# Altium footprint library my Library.PcbLib: 1247 footprints (part 71 of 78)
Each footprint in its own frame and in the unit in brackets; x right, y up, seen from the top. Pads: shape width x height; smd on the part's side, far side on the other; paste and mask are expansions set on the pad; w line width, h text height; cw(c..) or ccw(c..) is an arc to the next point about the centre after c.
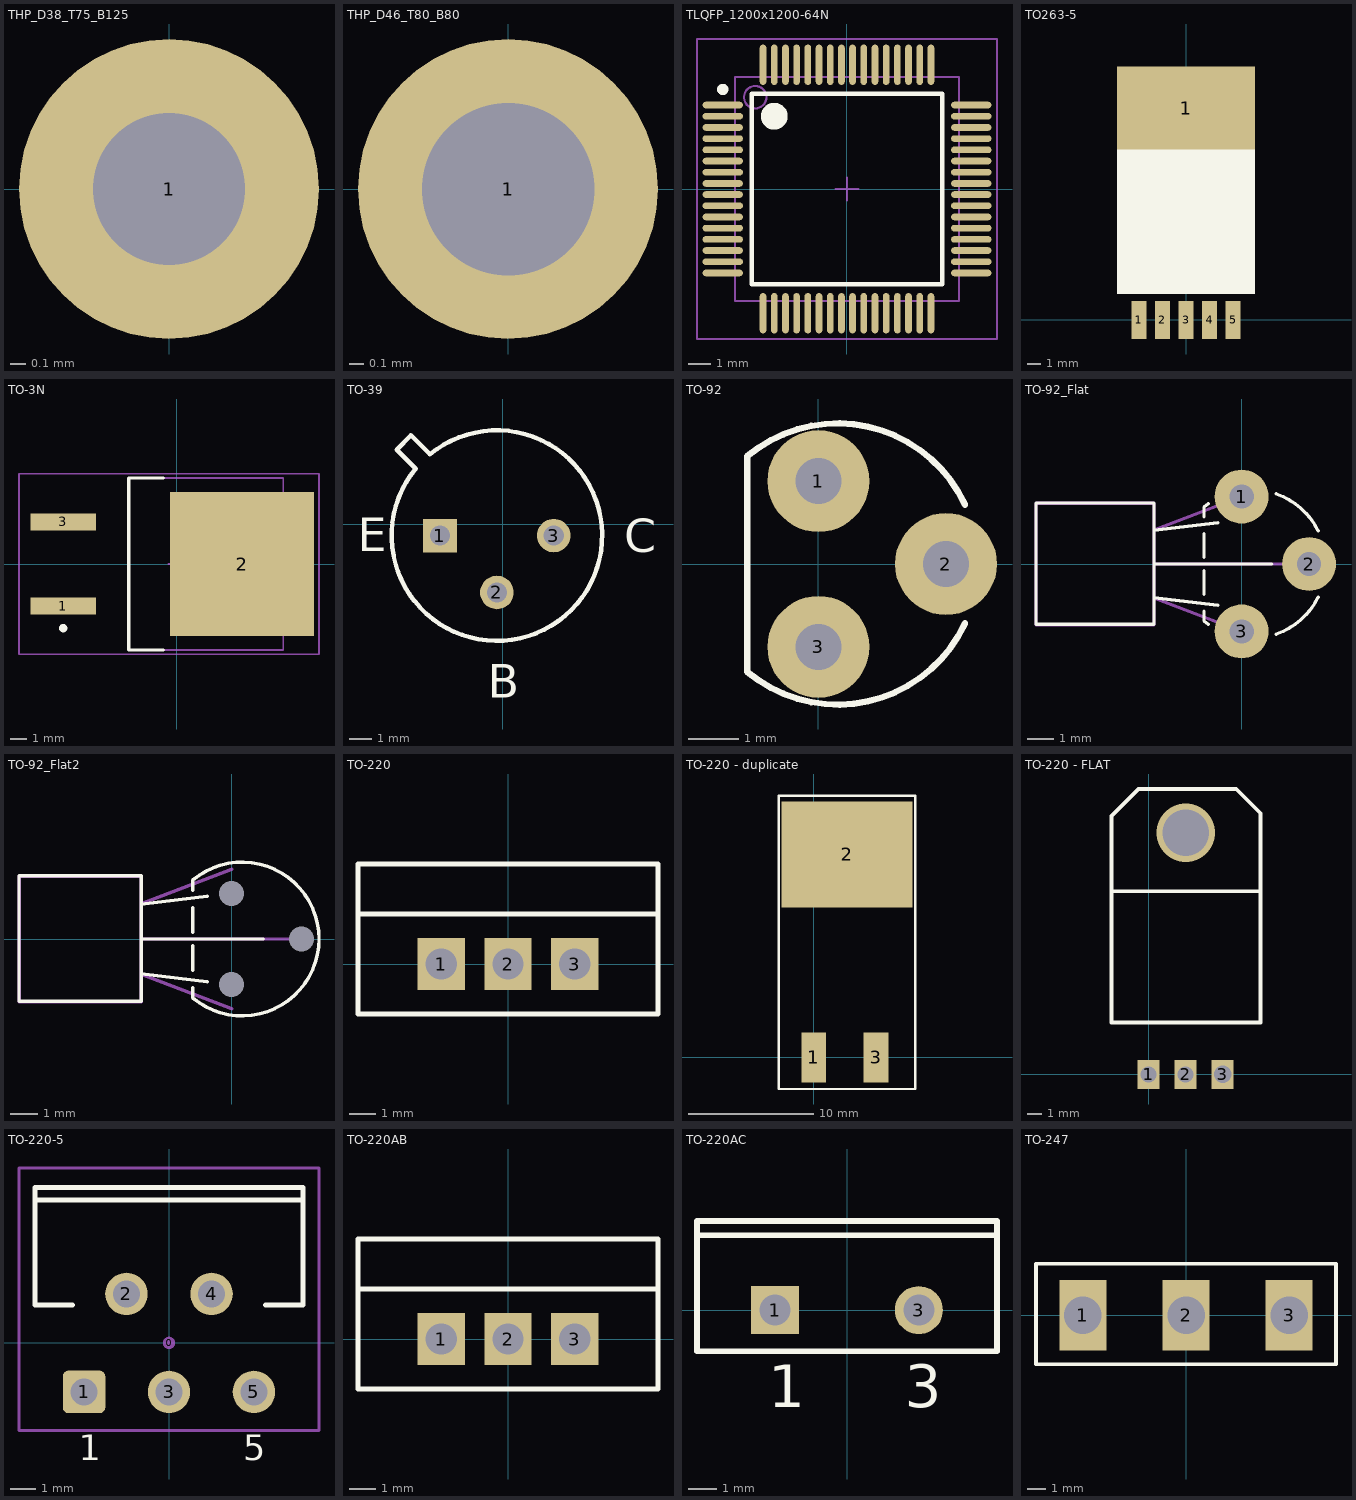
[diagram p70: the footprints below, top view; thin cyan lines are the x and y axes]

## THP_D38_T75_B125 [mil] "Thru-Hole Pad with 75mil top and 125mil bottom annular rings"
pads (1):
  round 75 / inner round 75 / far side round 125 hole 38: 1(0,0)

## THP_D46_T80_B80 [mil]
height 700.79
pads (1):
  round 80 hole 46: 1(0,0)

## TLQFP_1200x1200-64N [mm] "Thin QFP, 64-Leads, Body 10x10mm, Pitch 0.5mm, IPC Medium Density"
height 1.6
pads (64):
  oval 1.8x0.3 smd: 1(-5.55,3.75) 2(-5.55,3.25) 3(-5.55,2.75) 4(-5.55,2.25) 5(-5.55,1.75) 6(-5.55,1.25) 7(-5.55,0.75) 8(-5.55,0.25) 9(-5.55,-0.25) 10(-5.55,-0.75) 11(-5.55,-1.25) 12(-5.55,-1.75) 13(-5.55,-2.25) 14(-5.55,-2.75) 15(-5.55,-3.25) 16(-5.55,-3.75) 33(5.55,-3.75) 34(5.55,-3.25) 35(5.55,-2.75) 36(5.55,-2.25) 37(5.55,-1.75) 38(5.55,-1.25) 39(5.55,-0.75) 40(5.55,-0.25) 41(5.55,0.25) 42(5.55,0.75) 43(5.55,1.25) 44(5.55,1.75) 45(5.55,2.25) 46(5.55,2.75) 47(5.55,3.25) 48(5.55,3.75)
  oval 0.3x1.8 smd: 17(-3.75,-5.55) 18(-3.25,-5.55) 19(-2.75,-5.55) 20(-2.25,-5.55) 21(-1.75,-5.55) 22(-1.25,-5.55) 23(-0.75,-5.55) 24(-0.25,-5.55) 25(0.25,-5.55) 26(0.75,-5.55) 27(1.25,-5.55) 28(1.75,-5.55) 29(2.25,-5.55) 30(2.75,-5.55) 31(3.25,-5.55) 32(3.75,-5.55) 49(3.75,5.55) 50(3.25,5.55) 51(2.75,5.55) 52(2.25,5.55) 53(1.75,5.55) 54(1.25,5.55) 55(0.75,5.55) 56(0.25,5.55) 57(-0.25,5.55) 58(-0.75,5.55) 59(-1.25,5.55) 60(-1.75,5.55) 61(-2.25,5.55) 62(-2.75,5.55) 63(-3.25,5.55) 64(-3.75,5.55)
Top Overlay:
  circle w0.6: c-3.25,3.25 r0.3
  circle w0.25: c-5.55,4.45 r0.125
  lines w0.2: -4.25,-4.25 4.25,-4.25 4.25,4.25 -4.25,4.25 -4.25,-4.25
Mechanical 13:
  circle w0.1: c-4.1,4.1 r0.5
  lines w0.1: -5,-5 5,-5 5,5 -5,5 -5,-5
Mechanical 15:
  lines w0.1: -0.5,0 0.5,0 ; 0,-0.5 0,0.5 ; -6.7,-6.7 6.7,-6.7 6.7,6.7 -6.7,6.7 -6.7,-6.7
3D body: height 1.6, standoff 0, extent -5,-5 5,5

## TO263-5 [mm] "LM2576-SMD"
pads (6):
  rect 1.07x2.75 smd: 1(-3.4,-0.025) 2(-1.7,-0.025) 3(0,-0.025) 4(1.7,-0.025) 5(3.4,-0.025)
  rect 10x6 smd: 1(0,15.289)
Top Overlay:
  rectangle: -5,1.854 5,12.878
3D body "SW3dPS-TO263-5.STEP": height 4.79, standoff -0.01, extent -5,-0.381 5,15.289

## TO-3N [mm]
pads (3):
  rect 3.95x1.05 smd: 1(-6.858,-2.54) 3(-6.858,2.54)
  rect 8.7x8.7 smd: 2(3.95,0)
Top Overlay:
  circle w0.25: c-6.858,-3.878 r0.125
  lines w0.2: -0.8,-5.2 -2.9,-5.2 -2.9,5.2 -0.8,5.2
Mechanical 13:
  lines w0.1: -2.9,-5.2 6.45,-5.2 6.45,5.2 -2.9,5.2 -2.9,-5.2
Mechanical 15:
  lines w0.1: -0.5,0 0.5,0 ; 0,-0.5 0,0.5 ; -9.525,-5.45 8.6,-5.45 8.6,5.45 -9.525,5.45 -9.525,-5.45
3D body: height 4.6, standoff 0.45, extent -2.9,-5.2 6.45,5.2

## TO-39 [mm]
pads (3):
  rect 1.5x1.5 hole 0.9: 1(-2.794,-0.508)
  round 1.5 hole 0.9: 2(-0.254,-3.048) 3(2.286,-0.508)
Top Overlay:
  lines w0.2: -4.729,3.33 -4.092,3.967 -3.244,3.118 cw(c-0.254,-0.508) -3.88,2.482 -4.729,3.33
  text "C" at 5.44,-1.259 h1.5
  text "B" at -0.669,-7.746 h1.5
  text "E" at -6.455,-1.205 h1.5
3D body "User Library-TO-39_TO-205AD.STEP": height 6.6, standoff -11.82, extent -4.947,-5.207 4.439,4.193

## TO-92 [mil]
height 397.64
pads (3):
  round 80 hole 36: 1(0,65) 2(100,0) 3(0,-65)
Top Overlay:
  lines w5: 114.91,-46.59 cw(c15,0) -55.86,-84.45 -55.86,84.45 cw(c15,0) 114.91,46.59
3D body "TO-92_A.stp": height 404.72, standoff -100, extent -54.52,-94.57 107.49,94.56

## TO-92_Flat [mil]
height 151.57
pads (3):
  round 80 hole 36: 1(0,100) 2(100,0) 3(0,-100)
Top Overlay:
  lines w5: -130.03,0 45,0 ; -130,-50 -35.14,-61.16 ; -130,50 -35.14,61.16 ; -55.86,-70 -55.86,-84.45 ccw(c15,0) -49.54,-89.37 ; -55.86,-45 -55.86,-10 ; -55.86,10 -55.86,45 ; -55.86,70 -55.86,84.45 cw(c15,0) -49.54,89.37 ; 51.42,-104.05 ccw(c15,0) 113.6,-49.3 ; 51.42,104.05 cw(c15,0) 113.6,49.3 ; -305.03,-89.45 -305.03,90.55 -130.03,90.55 -130.03,-89.45 -305.03,-89.45
Mechanical 13:
  lines w5: -130,-50.44 0,-100 ; -130,0.1 100,0 ; -130,50.44 0,100 ; -305,-90 -305,90 -130,90 -130,-90 -305,-90
3D body "TO-92_Flat.STEP": height 141.73, standoff -100, extent -307.08,-109.84 109.85,109.85

## TO-92_Flat2 [mil]
height 151.57
pads (3):
  round 0 / inner round 0 / far side round 80 hole 36 unplated: 1(0,65) 2(100,0) 3(0,-65)
Top Overlay:
  lines w5: -130.03,0 45,0 ; -130,-50 -35.14,-61.16 ; -130,50 -35.14,61.16 ; -55.86,-70 -55.86,-84.45 ccw(c15,0) -55.86,84.45 -55.86,70 ; -55.86,-45 -55.86,-10 ; -55.86,10 -55.86,45 ; -305.03,-89.45 -305.03,90.55 -130.03,90.55 -130.03,-89.45 -305.03,-89.45
Mechanical 13:
  lines w5: -130,-50.44 0,-100 ; -130,0.1 100,0 ; -130,50.44 0,100 ; -305,-90 -305,90 -130,90 -130,-90 -305,-90
3D body "TO-92_Flat_Narrow.STEP": height 141.73, standoff -100, extent -307.08,-94.48 109.85,94.5

## TO-220 [mm]
pads (3):
  rect 1.8x2 hole 1.2: 1(-2.54,0) 2(0,0) 3(2.54,0)
Top Overlay:
  lines w0.2: -5.715,1.905 5.715,1.905 ; -5.715,-1.905 5.715,-1.905 5.715,3.81 -5.715,3.81 -5.715,2.54 -5.715,-1.905
3D body "User Library-TO-220-3.step": height 8.08, standoff -20.7, extent -4.925,-2.134 4.975,2.366

## TO-220 - duplicate [mm]
pads (3):
  rect 2x4 smd: 1(0,0) 3(5,0)
  rect 10.5x8.5 smd: 2(2.667,16.256)
Top Overlay:
  lines w0.2: -2.794,-2.54 8.128,-2.54 8.128,20.955 -2.794,20.955 -2.794,-2.54
3D body "SW3DPS-TO-220-DEFAULT.STEP": height 4.2, standoff -3, extent -2.413,1.05 7.747,20.54

## TO-220 - FLAT [mm]
pads (3):
  rect 1.5x2 hole 1.1: 1(0,0) 2(2.54,0)
  rect 1.5x2 hole 1.2: 3(5.08,0)
via 2.54,16.562 diameter 4 hole 3.2
Top Overlay:
  lines w0.254: -2.54,5.861 -2.54,17.71 -0.686,19.564 6.007,19.564 7.671,17.901 7.671,3.562 -2.54,3.562 -2.54,12.554 7.671,12.554
3D body "TO220_NAM.step": height 4.45, standoff -1.79, extent -2.54,-0.19 7.62,19.09

## TO-220-5 [mm] "TO, Thru-Hole, Vertical, Heatsink Mounted; 5 Bent Staggered Leads; Pitch 1.7mm"
height 21.1
pads (6):
  round 0.5 on Mech15: 0(0,0)
  rrect25% 1.7x1.7 hole 1.092: 1(-3.4,-1.96)
  round 1.7 hole 1.092: 2(-1.7,1.96) 3(0,-1.96) 4(1.7,1.96) 5(3.4,-1.96)
Top Overlay:
  lines w0.2: -5.35,5.71 5.35,5.71 ; -3.854,1.51 -5.35,1.51 -5.35,6.21 5.35,6.21 5.35,1.51 3.854,1.51
  text "1" at -3.62,-4.685 h1.02
  text "5" at 2.98,-4.685 h1.02
Mechanical 15:
  lines w0.127: -6,-3.5 -6,7 6,7 6,-3.5 -6,-3.5
3D body "SW3dPS-TO220-5.STEP": height 20.99, standoff -3, extent -5.08,-2.16 5.08,6.08

## TO-220AB [mm]
pads (3):
  rect 1.8x2 hole 1.2: 1(-2.54,0) 2(0,0) 3(2.54,0)
Top Overlay:
  lines w0.2: -5.715,1.905 5.715,1.905 ; -5.715,-1.905 5.715,-1.905 5.715,3.81 -5.715,3.81 -5.715,2.54 -5.715,-1.905
3D body "SW3dPS-TO220AB.STEP": height 21.71, standoff -7.62, extent -5.606,-1.749 5.607,2.941

## TO-220AC [mm] "TO, Thru-Hole, Vertical, Heatsink Mounted; 3 In-Line Leads (1 Absent); Pitch 2.54 mm"
height 19.2
pads (2):
  rect 1.7x1.7 hole 1.1: 1(-2.54,0)
  round 1.7 hole 1.1: 3(2.54,0)
Top Overlay:
  lines w0.2: -5.3,2.65 5.3,2.65 ; -5.3,-1.45 -5.3,3.15 5.3,3.15 5.3,-1.45 -5.3,-1.45
  text "3" at 2.04,-3.425 h1.5
  text "1" at -2.79,-3.425 h1.5

## TO-247 [mil]
pads (3):
  rect 100x150 hole 80: 1(-220,0) 2(0,0) 3(220,0)
Top Overlay:
  lines w7.87: -320,-105 320,-105 320,110 -320,110 -320,-25 -320,-105
3D body "User Library-TO247.STEP": height 951.13, standoff -698.87, extent -320.08,-100 320.08,108.66